# Altium footprint library 16-PCBa Modl.PcbLib: 81 footprints (part 5 of 6)
Each footprint in its own frame and in the unit in brackets; x right, y up, seen from the top. Pads: shape width x height; smd on the part's side, far side on the other; paste and mask are expansions set on the pad; w line width, h text height; cw(c..) or ccw(c..) is an arc to the next point about the centre after c.
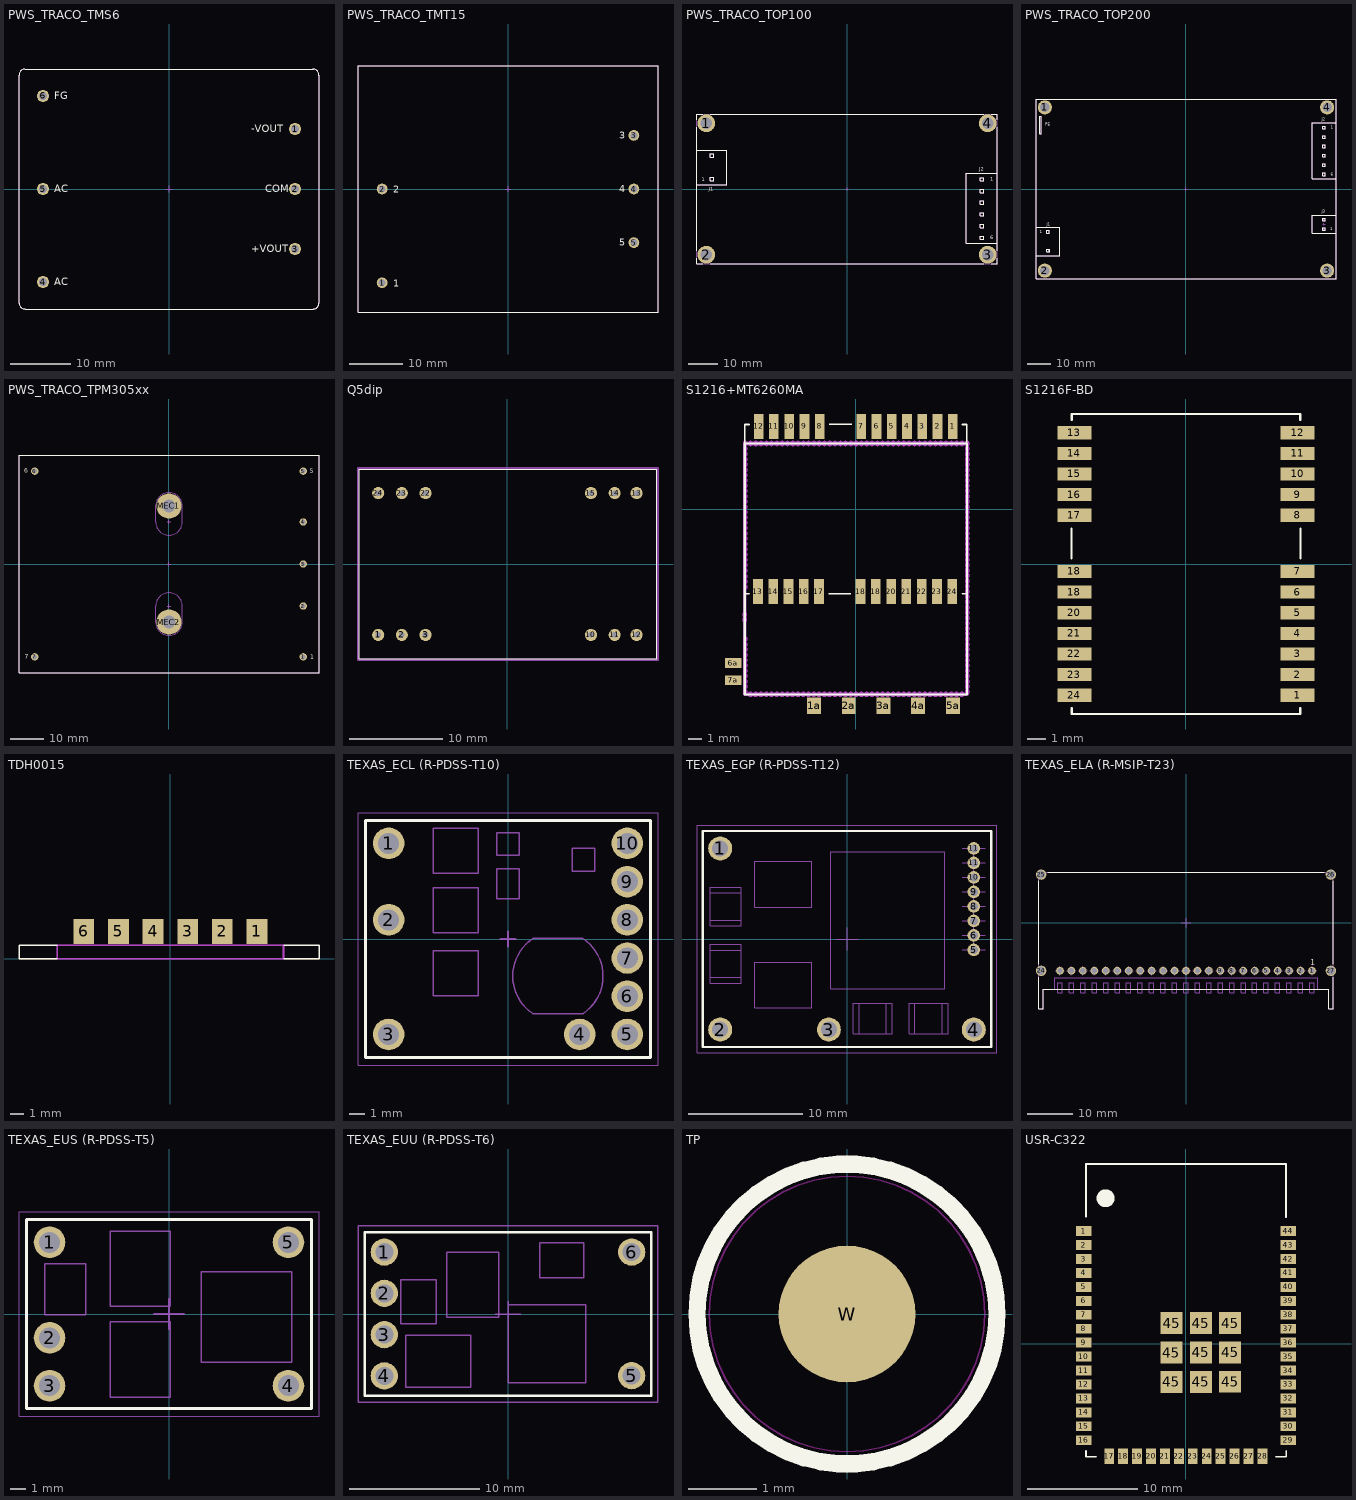
[diagram p4: the footprints below, top view; thin cyan lines are the x and y axes]

## PWS_TRACO_TMS6 [mm] "TMS 6 Series , Body 50x40mm, Height 20mm"
height 20
pads (6):
  round 2 hole 1.3: 1(21,10) 2(21,0) 3(21,-10) 4(-21,-15.5) 5(-21,0) 6(-21,15.5)
Top Overlay:
  lines w0.2: -25,-19 ccw(c-24,-19) -24,-20 24,-20 ccw(c24,-19) 25,-19 25,19 ccw(c24,19) 24,20 -24,20 ccw(c-24,19) -25,19 -25,-19
  text "-VOUT" at 13.719,9.495 h1.2
  text "COM" at 16.025,-0.55 h1.2
  text "+VOUT" at 13.719,-10.505 h1.2
  text "FG" at -19.125,14.95 h1.2
  text "AC" at -19.125,-0.55 h1.2
  text "AC" at -19.125,-16.05 h1.2
Mechanical 8:
  lines w0.1: -21.5,-15.5 -21,-15.5 ; -21.5,0 -21,0 ; -21.5,15.5 -21,15.5 ; -21,-16 -21,-15.5 ; -21,-15 -21,-15.5 ; -21,-0.5 -21,0 ; -21,0.5 -21,0 ; -21,15 -21,15.5 ; -21,16 -21,15.5 ; -20.5,-15.5 -21,-15.5 ; -20.5,0 -21,0 ; -20.5,15.5 -21,15.5 ; -0.5,0 0,0 ; 0,-0.5 0,0 ; 0,0.5 0,0 ; 0.5,0 0,0 ; 20.5,-10 21,-10 ; 20.5,0 21,0 ; 20.5,10 21,10 ; 21,-10.5 21,-10 ; 21,-9.5 21,-10 ; 21,-0.5 21,0 ; 21,0.5 21,0 ; 21,9.5 21,10 ; 21,10.5 21,10 ; 21.5,-10 21,-10 ; 21.5,0 21,0 ; 21.5,10 21,10
Mechanical 14:
  lines w0.1: -25,-19 ccw(c-24,-19) -24,-20 24,-20 ccw(c24,-19) 25,-19 25,19 ccw(c24,19) 24,20 -24,20 ccw(c-24,19) -25,19 -25,-19
  text "AC" at -19.125,-16.05 h1.2
  text "AC" at -19.125,-0.55 h1.2
  text "FG" at -19.125,14.95 h1.2
  text "+VOUT" at 13.719,-10.505 h1.2
  text "COM" at 16.025,-0.55 h1.2
  text "-VOUT" at 13.719,9.495 h1.2
3D body "PWS_TRACO_TMS6.stp": height 20.1, standoff -3.6, extent -25,-20 25,20

## PWS_TRACO_TMT15 [mm] "TMT  15W Model For PCB Mount, Body 55x45mm"
height 25
pads (5):
  round 2 hole 1.3: 1(-23.5,-17.5) 2(-23.5,0) 3(23.5,10) 4(23.5,0) 5(23.5,-10)
Top Overlay:
  lines w0.2: -28,-23 28,-23 28,23 -28,23 -28,-23
  text "3" at 20.72,9.41 h1.27
  text "4" at 20.72,-0.59 h1.27
  text "5" at 20.72,-10.59 h1.27
  text "2" at -21.42,-0.71 h1.27
  text "1" at -21.42,-18.21 h1.27
Mechanical 8:
  lines w0.1: -24,-17.5 -23.5,-17.5 ; -24,0 -23.5,0 ; -23.5,-18 -23.5,-17.5 ; -23.5,-17 -23.5,-17.5 ; -23.5,-0.5 -23.5,0 ; -23.5,0.5 -23.5,0 ; -23,-17.5 -23.5,-17.5 ; -23,0 -23.5,0 ; -0.5,0 0,0 ; 0,-0.5 0,0 ; 0,0.5 0,0 ; 0.5,0 0,0 ; 23,-10 23.5,-10 ; 23,0 23.5,0 ; 23,10 23.5,10 ; 23.5,-10.5 23.5,-10 ; 23.5,-9.5 23.5,-10 ; 23.5,-0.5 23.5,0 ; 23.5,0.5 23.5,0 ; 23.5,9.5 23.5,10 ; 23.5,10.5 23.5,10 ; 24,-10 23.5,-10 ; 24,0 23.5,0 ; 24,10 23.5,10
Mechanical 14:
  lines w0.1: -28,-23 -28,23 28,23 28,-23 -28,-23
  text "3" at 20.72,9.41 h1.27
  text "4" at 20.72,-0.59 h1.27
  text "5" at 20.72,-10.59 h1.27
  text "2" at -21.42,-0.71 h1.27
  text "1" at -21.42,-18.21 h1.27
3D body "PWS_TRACO_TMT15.stp": height 25, standoff -3.8, extent -28,-23 28,23

## PWS_TRACO_TOP100 [mm] "TOP 100 Serie 100W Power Supplies, Body 101.6 x 50.8mm"
height 33.2
pads (4):
  round 6 hole 4: 1(-47.65,22.25) 2(-47.65,-22.25) 3(47.65,-22.25) 4(47.65,22.25)
Top Overlay:
  lines w0.2: -50.8,-23.53 -50.8,-25.4 -48.93,-25.4 ; -50.8,-20.97 -50.8,20.97 ; -50.8,1.465 -40.792,1.465 -40.792,13.2 -50.8,13.2 ; -50.8,23.53 -50.8,25.4 -48.93,25.4 ; -46.37,-25.4 46.37,-25.4 ; -46.37,25.4 46.37,25.4 ; 48.93,-25.4 50.8,-25.4 50.8,-23.53 ; 48.93,25.4 50.8,25.4 50.8,23.53 ; 50.8,-20.97 50.8,20.97 ; 50.8,-3.16 50.8,-18.4 40.4,-18.4 40.4,5.34 50.8,5.34 ; -46.266,2.799 -45.123,2.799 -45.123,3.942 -46.266,3.942 -46.266,2.799 ; -46.266,10.724 -45.123,10.724 -45.123,11.867 -46.266,11.867 -46.266,10.724 ; 45.123,-17.067 46.266,-17.067 46.266,-15.924 45.123,-15.924 45.123,-17.067 ; 45.123,-13.104 46.266,-13.104 46.266,-11.961 45.123,-11.961 45.123,-13.104 ; 45.123,-9.142 46.266,-9.142 46.266,-7.999 45.123,-7.999 45.123,-9.142 ; 45.123,-5.179 46.266,-5.179 46.266,-4.036 45.123,-4.036 45.123,-5.179 ; 45.123,-1.217 46.266,-1.217 46.266,-0.074 45.123,-0.074 45.123,-1.217 ; 45.123,2.746 46.266,2.746 46.266,3.889 45.123,3.889 45.123,2.746
  text "J1" at -46.825,-0.51 h1.2
  text "J2" at 44.775,6.19 h1.2
  text "1" at 48.525,2.79 h1.2
  text "6" at 48.525,-17.022 h1.2
  text "1" at -49.141,2.644 h1.2
Mechanical 8:
  lines w0.1: -48.15,-22.25 -47.65,-22.25 ; -48.15,22.25 -47.65,22.25 ; -47.65,-22.75 -47.65,-22.25 ; -47.65,-21.75 -47.65,-22.25 ; -47.65,21.75 -47.65,22.25 ; -47.65,22.75 -47.65,22.25 ; -47.15,-22.25 -47.65,-22.25 ; -47.15,22.25 -47.65,22.25 ; -0.5,0 0,0 ; 0,-0.5 0,0 ; 0,0.5 0,0 ; 0.5,0 0,0 ; 47.15,-22.25 47.65,-22.25 ; 47.15,22.25 47.65,22.25 ; 47.65,-22.75 47.65,-22.25 ; 47.65,-21.75 47.65,-22.25 ; 47.65,21.75 47.65,22.25 ; 47.65,22.75 47.65,22.25 ; 48.15,-22.25 47.65,-22.25 ; 48.15,22.25 47.65,22.25
Mechanical 14:
  circle w0.1: c-47.65,-22.25 r2
  circle w0.1: c-47.65,22.25 r2
  circle w0.1: c47.65,22.25 r2
  circle w0.1: c47.65,-22.25 r2
  lines w0.1: -50.8,1.465 -40.792,1.465 -40.792,13.2 -50.8,13.2 ; 50.8,-18.4 40.4,-18.4 40.4,5.34 50.8,5.34 ; -50.8,-25.4 50.8,-25.4 50.8,25.4 -50.8,25.4 -50.8,-25.4 ; -46.266,2.799 -45.123,2.799 -45.123,3.942 -46.266,3.942 -46.266,2.799 ; -46.266,10.724 -45.123,10.724 -45.123,11.867 -46.266,11.867 -46.266,10.724 ; 45.123,-17.067 46.266,-17.067 46.266,-15.924 45.123,-15.924 45.123,-17.067 ; 45.123,-13.104 46.266,-13.104 46.266,-11.961 45.123,-11.961 45.123,-13.104 ; 45.123,-9.142 46.266,-9.142 46.266,-7.999 45.123,-7.999 45.123,-9.142 ; 45.123,-5.179 46.266,-5.179 46.266,-4.036 45.123,-4.036 45.123,-5.179 ; 45.123,-1.217 46.266,-1.217 46.266,-0.074 45.123,-0.074 45.123,-1.217 ; 45.123,2.746 46.266,2.746 46.266,3.889 45.123,3.889 45.123,2.746
  text "J1" at -46.825,-0.51 h1.2
  text "J2" at 44.775,6.19 h1.2
  text "1" at 48.525,2.79 h1.2
  text "6" at 48.525,-17.022 h1.2
  text "1" at -49.141,2.644 h1.2
3D body "PWS_TRACO_TOP100.stp": height 34.8, standoff -5.4, extent -50.8,-25.425 50.8,25.426

## PWS_TRACO_TOP200 [mm] "TOP 200 Serie 200W Power Supplies, Body 127 x 76.2mm"
height 35.4
pads (4):
  round 6 hole 4: 1(-59.75,34.55) 2(-59.75,-34.55) 3(59.75,-34.55) 4(59.75,34.55)
Top Overlay:
  lines w0.2: -63.5,-28.219 -53.492,-28.219 -53.492,-16.205 -63.5,-16.205 ; 56.236,4.293 63.5,4.318 53.492,4.318 53.492,27.975 63.5,27.975 ; 59.436,-18.8 57.214,-18.8 63.5,-18.8 ; 59.436,-11.028 57.214,-11.028 63.5,-11.028 ; 61.576,-18.8 63.5,-18.8 ; 61.576,-11.028 63.5,-11.028 ; -58.966,-26.607 -57.823,-26.607 -57.823,-25.464 -58.966,-25.464 ; -58.966,-26.607 -58.966,-25.464 ; -58.966,-26.607 -58.966,-25.464 ; -58.966,-26.607 -57.747,-26.607 -57.747,-25.464 -58.966,-25.464 ; -58.966,-18.682 -57.823,-18.682 ; -58.966,-18.682 -58.966,-17.539 ; -58.966,-18.682 -58.966,-17.539 ; -58.966,-18.682 -57.823,-18.682 ; -58.966,-17.539 -57.823,-17.539 ; -58.966,-17.539 -57.823,-17.539 ; -57.823,-18.682 -57.823,-17.539 ; -57.823,-18.682 -57.823,-17.539 ; 63.5,-18.8 53.492,-18.8 53.492,-11.028 63.5,-11.028 ; -63.5,-38.1 -63.5,38.1 63.5,38.1 63.5,-38.1 -63.5,-38.1 ; -62,23.307 -61.2,23.307 -61.2,30.8 -62,30.8 -62,23.307 ; 57.823,-17.467 58.966,-17.467 58.966,-16.324 57.823,-16.324 57.823,-17.467 ; 57.823,-13.504 58.966,-13.504 58.966,-12.361 57.823,-12.361 57.823,-13.504 ; 57.823,5.652 58.966,5.652 58.966,6.795 57.823,6.795 57.823,5.652 ; 57.823,9.614 58.966,9.614 58.966,10.757 57.823,10.757 57.823,9.614 ; 57.823,13.576 58.966,13.576 58.966,14.719 57.823,14.719 57.823,13.576 ; 57.823,17.539 58.966,17.539 58.966,18.682 57.823,18.682 57.823,17.539 ; 57.823,21.501 58.966,21.501 58.966,22.644 57.823,22.644 57.823,21.501 ; 57.823,25.464 58.966,25.464 58.966,26.607 57.823,26.607 57.823,25.464
  text "1" at 61.025,-17.554 h1.2
  text "J3" at 57.541,-10.109 h1.2
  text "PE" at -59.659,26.691 h1.2
  text "1" at -61.841,-18.836 h1.2
  text "J1" at -58.925,-15.515 h1.2
  text "6" at 61.225,5.696 h1.2
  text "1" at 61.225,25.508 h1.2
  text "J2" at 57.475,28.908 h1.2
Mechanical 8:
  lines w0.1: -60.25,-34.55 -59.75,-34.55 ; -60.25,34.55 -59.75,34.55 ; -59.75,-35.05 -59.75,-34.55 ; -59.75,-34.05 -59.75,-34.55 ; -59.75,34.05 -59.75,34.55 ; -59.75,35.05 -59.75,34.55 ; -59.25,-34.55 -59.75,-34.55 ; -59.25,34.55 -59.75,34.55 ; -0.5,0 0,0 ; 0,-0.5 0,0 ; 0,0.5 0,0 ; 0.5,0 0,0 ; 57.895,-16.895 58.395,-16.895 ; 57.895,-14.914 58.395,-14.914 ; 57.895,-12.933 58.395,-12.933 ; 58.395,-17.395 58.395,-16.895 ; 58.395,-16.395 58.395,-16.895 ; 58.395,-15.414 58.395,-14.914 ; 58.395,-14.414 58.395,-14.914 ; 58.395,-13.433 58.395,-12.933 ; 58.395,-12.433 58.395,-12.933 ; 58.895,-16.895 58.395,-16.895 ; 58.895,-14.914 58.395,-14.914 ; 58.895,-12.933 58.395,-12.933 ; 59.25,-34.55 59.75,-34.55 ; 59.25,34.55 59.75,34.55 ; 59.75,-35.05 59.75,-34.55 ; 59.75,-34.05 59.75,-34.55 ; 59.75,34.05 59.75,34.55 ; 59.75,35.05 59.75,34.55 ; 60.25,-34.55 59.75,-34.55 ; 60.25,34.55 59.75,34.55
Mechanical 14:
  circle w0.1: c-59.75,34.55 r2
  circle w0.1: c-59.75,-34.55 r2
  circle w0.1: c59.75,-34.55 r2
  circle w0.1: c59.75,34.55 r2
  lines w0.1: -63.5,-28.219 -53.492,-28.219 -53.492,-16.205 -63.5,-16.205 ; 56.236,4.293 63.5,4.318 53.492,4.318 53.492,27.975 63.5,27.975 ; 59.436,-18.8 57.214,-18.8 63.5,-18.8 ; 59.436,-11.028 57.214,-11.028 63.5,-11.028 ; 61.576,-18.8 63.5,-18.8 ; 61.576,-11.028 63.5,-11.028 ; -58.966,-26.607 -57.823,-26.607 -57.823,-25.464 -58.966,-25.464 ; -58.966,-26.607 -58.966,-25.464 ; -58.966,-26.607 -58.966,-25.464 ; -58.966,-26.607 -57.747,-26.607 -57.747,-25.464 -58.966,-25.464 ; -58.966,-18.682 -57.823,-18.682 ; -58.966,-18.682 -58.966,-17.539 ; -58.966,-18.682 -58.966,-17.539 ; -58.966,-18.682 -57.823,-18.682 ; -58.966,-17.539 -57.823,-17.539 ; -58.966,-17.539 -57.823,-17.539 ; -57.823,-18.682 -57.823,-17.539 ; -57.823,-18.682 -57.823,-17.539 ; 63.5,-18.8 63.5,-11.028 ; 63.5,-18.8 53.492,-18.8 53.492,-11.028 63.5,-11.028 ; -63.5,-38.1 -63.5,38.1 63.5,38.1 63.5,-38.1 -63.5,-38.1 ; -62,23.307 -61.2,23.307 -61.2,30.8 -62,30.8 -62,23.307 ; 57.823,-17.467 58.966,-17.467 58.966,-16.324 57.823,-16.324 57.823,-17.467 ; 57.823,-13.504 58.966,-13.504 58.966,-12.361 57.823,-12.361 57.823,-13.504 ; 57.823,5.652 58.966,5.652 58.966,6.795 57.823,6.795 57.823,5.652 ; 57.823,9.614 58.966,9.614 58.966,10.757 57.823,10.757 57.823,9.614 ; 57.823,13.576 58.966,13.576 58.966,14.719 57.823,14.719 57.823,13.576 ; 57.823,17.539 58.966,17.539 58.966,18.682 57.823,18.682 57.823,17.539 ; 57.823,21.501 58.966,21.501 58.966,22.644 57.823,22.644 57.823,21.501 ; 57.823,25.464 58.966,25.464 58.966,26.607 57.823,26.607 57.823,25.464
  text "1" at 61.025,-17.554 h1.2
  text "J3" at 57.541,-10.109 h1.2
  text "PE" at -59.659,26.691 h1.2
  text "1" at -61.841,-18.836 h1.2
  text "J1" at -58.925,-15.515 h1.2
  text "6" at 61.225,5.696 h1.2
  text "1" at 61.225,25.508 h1.2
  text "J2" at 57.475,28.908 h1.2
3D body "PWS_TRACO_TOP200.stp": height 35.4, standoff -5.4, extent -63.5,-38.1 63.5,38.1

## PWS_TRACO_TPM305xx [mm] "TPM  30/40W Model For PCB Mount, Body 90x65mm"
height 33.5
pads (9):
  round 2.2 hole 1.5: 1(40.5,-28) 2(40.5,-12.7) 3(40.5,0) 4(40.5,12.7) 5(40.5,28) 6(-40.5,28) 7(-40.5,-28)
  round 7.6 hole 3.8: MEC1(0,17.5) MEC2(0,-17.5)
Top Overlay:
  lines w0.2: -45.25,-32.75 -45.25,32.75 45.25,32.75 45.25,-32.75 -45.25,-32.75
  text "5" at 42.48,27.365 h1.27
  text "7" at -43.52,-28.605 h1.27
  text "6" at -43.72,27.46 h1.27
  text "1" at 42.58,-28.71 h1.27
Mechanical 8:
  lines w0.1: -41,-28 -40.5,-28 ; -41,28 -40.5,28 ; -40.5,-28.5 -40.5,-28 ; -40.5,-27.5 -40.5,-28 ; -40.5,27.5 -40.5,28 ; -40.5,28.5 -40.5,28 ; -40,-28 -40.5,-28 ; -40,28 -40.5,28 ; -0.5,-17.5 0,-17.5 ; -0.5,-12.7 0,-12.7 ; -0.5,0 0,0 ; -0.5,12.7 0,12.7 ; -0.5,17.5 0,17.5 ; 0,-18 0,-17.5 ; 0,-17 0,-17.5 ; 0,-13.2 0,-12.7 ; 0,-12.2 0,-12.7 ; 0,-0.5 0,0 ; 0,0.5 0,0 ; 0,12.2 0,12.7 ; 0,13.2 0,12.7 ; 0,17 0,17.5 ; 0,18 0,17.5 ; 0.5,-17.5 0,-17.5 ; 0.5,-12.7 0,-12.7 ; 0.5,0 0,0 ; 0.5,12.7 0,12.7 ; 0.5,17.5 0,17.5 ; 40,-28 40.5,-28 ; 40,-12.7 40.5,-12.7 ; 40,0 40.5,0 ; 40,12.7 40.5,12.7 ; 40,28 40.5,28 ; 40.5,-28.5 40.5,-28 ; 40.5,-27.5 40.5,-28 ; 40.5,-13.2 40.5,-12.7 ; 40.5,-12.2 40.5,-12.7 ; 40.5,-0.5 40.5,0 ; 40.5,0.5 40.5,0 ; 40.5,12.2 40.5,12.7 ; 40.5,13.2 40.5,12.7 ; 40.5,27.5 40.5,28 ; 40.5,28.5 40.5,28 ; 41,-28 40.5,-28 ; 41,-12.7 40.5,-12.7 ; 41,0 40.5,0 ; 41,12.7 40.5,12.7 ; 41,28 40.5,28 ; -4,-17.5 ccw(c0,-17.5) 4,-17.5 4,-12.7 ccw(c0,-12.7) -4,-12.7 -4,-17.5 ; -4,12.7 ccw(c0,12.7) 4,12.7 4,17.5 ccw(c0,17.5) -4,17.5 -4,12.7
Mechanical 14:
  lines w0.1: -45.25,-32.75 -45.25,32.75 45.25,32.75 45.25,-32.75 -45.25,-32.75
  text "5" at 42.48,27.365 h1.27
  text "7" at -43.52,-28.605 h1.27
  text "6" at -43.72,27.46 h1.27
  text "1" at 42.58,-28.71 h1.27
3D body "PWS_TRACO_TPM305xx.stp": height 33.5, standoff -3.6, extent -45.25,-32.75 45.25,32.75

## Q5dip [mm]
height 26.7
pads (12):
  round 1.3 hole 0.6: 1(-13.88,-7.62) 2(-11.34,-7.62) 3(-8.8,-7.62) 10(8.98,-7.62) 11(11.52,-7.62) 12(13.88,-7.62) 13(13.88,7.62) 14(11.52,7.62) 15(8.98,7.62) 22(-8.8,7.62) 23(-11.34,7.62) 24(-13.88,7.62)
Top Overlay:
  lines w0.1: -15.91,-10.16 16.04,-10.16 16.04,10.16 -15.91,10.16 -15.91,-10.16
Mechanical 15:
  lines w0.254: -16.053,-10.287 -16.053,10.287 16.18,10.287 16.18,-10.287 -16.053,-10.287
3D body "q5dip.stp": height 10.18, standoff -3.81, extent -15.875,-10.16 15.875,10.16

## S1216+MT6260MA [mm]
height 26.7
pads (31):
  rect 0.7x1.8 smd: 1(7,5.95) 2(5.9,5.95) 3(4.8,5.95) 4(3.7,5.95) 5(2.6,5.95) 6(1.5,5.95) 7(0.4,5.95) 8(-2.6,5.95) 9(-3.7,5.95) 10(-4.8,5.95) 11(-5.9,5.95) 12(-7,5.95) 13(-7.051,-5.95) 14(-5.951,-5.95) 15(-4.851,-5.95) 16(-3.751,-5.95) 17(-2.651,-5.95) 18(0.349,-5.95) 18(1.449,-5.95) 20(2.549,-5.95) 21(3.649,-5.95) 22(4.749,-5.95) 23(5.849,-5.95) 24(6.949,-5.95)
  rect 1x1.2 smd: 1a(-3.001,-14.173) 2a(-0.501,-14.173) 3a(1.999,-14.173) 4a(4.499,-14.173) 5a(7.01,-14.173)
  rect 1.2x0.7 smd: 6a(-8.839,-11.1) 7a(-8.839,-12.344)
Top Overlay:
  lines w0.1: -1.951,-6.1 -0.351,-6.1 ; -1.9,6.1 -0.3,6.1
  lines w0.127: -8,-6.1 -8,6.1 -7.7,6.1 ; -7.975,-6.1 -7.675,-6.1 ; 7.675,-6.1 7.975,-6.1 ; 7.7,6.1 8,6.1 8,-6.1
  lines w0.152: 7.927,4.724 -8.001,4.724 -8.001,-13.36 8.026,-13.36 8.026,4.724
Keep-Out Layer:
  drawing of 173 lines, arcs and shapes, not listed
Mechanical 1:
  drawing of 173 lines, arcs and shapes, not listed
Mechanical 14:
  lines w0.254: 7.927,4.724 -8.001,4.724 -8.001,-13.36 8.026,-13.36 8.026,4.724
Mechanical 15:
  lines w0.254: 7.925,-13.36 -8.001,-13.36 -8.001,4.724 7.927,4.724
3D body "s1216f-bd_gps.stp": height 2.19, standoff 0, extent -7.975,-6.107 8.025,6.108

## S1216F-BD [mm]
height 26.7
pads (24):
  rect 1.8x0.7 smd: 1(5.95,-7) 2(5.95,-5.9) 3(5.95,-4.8) 4(5.95,-3.7) 5(5.95,-2.6) 6(5.95,-1.5) 7(5.95,-0.4) 8(5.95,2.6) 9(5.95,3.7) 10(5.95,4.8) 11(5.95,5.9) 12(5.95,7) 13(-5.95,7) 14(-5.95,5.9) 15(-5.95,4.8) 16(-5.95,3.7) 17(-5.95,2.6) 18(-5.95,-1.5) 18(-5.95,-0.4) 20(-5.95,-2.6) 21(-5.95,-3.7) 22(-5.95,-4.8) 23(-5.95,-5.9) 24(-5.95,-7)
Top Overlay:
  lines w0.1: -6.1,0.3 -6.1,1.9 ; 6.1,0.3 6.1,1.9
  lines w0.127: -6.1,-7.7 -6.1,-8 6.1,-8 6.1,-7.7 ; -6.1,7.7 -6.1,8 6.1,8 6.1,7.7
3D body "s1216f-bd_gps.stp": height 2.19, standoff 0, extent -6.107,-8 6.108,8

## TDH0015 [mm]
height 26.7
pads (6):
  rect 1.524x1.8 smd: 1(6.35,2) 2(3.81,2) 3(1.27,2) 4(-1.27,2) 5(-3.81,2) 6(-6.35,2)
Top Overlay:
  lines w0.1: -8.3,0 -11.1,0 -11.1,1 -8.3,1 ; 8.3,0 10.9,0 10.9,1 8.3,1
Keep-Out Layer:
  lines w0.125: -8.3,0 8.3,0 8.3,1 -8.3,1 -8.3,0
Mechanical 1:
  lines w0.125: -8.3,0 -8.3,1 8.3,1 8.3,0 -8.3,0
3D body "TDH0015.step": height 10.92, standoff -2.8, extent -11.239,-6.37 11.239,3.4

## TEXAS_ECL (R-PDSS-T10) [mm] "Texas ECL (R-PDSS-T10)  Case"
height 8.5
pads (10):
  round 2.1 hole 1.4: 1(-7.935,6.355) 2(-7.935,1.275) 3(-7.935,-6.345) 4(4.765,-6.345) 5(7.935,-6.345) 6(7.935,-3.805) 7(7.935,-1.265) 8(7.935,1.275) 9(7.935,3.815) 10(7.935,6.355)
Top Overlay:
  lines w0.2: -9.46,-7.875 9.46,-7.875 9.46,7.875 -9.46,7.875 -9.46,-7.875
Mechanical 8:
  lines w0.1: -8.435,-6.345 -7.935,-6.345 ; -8.435,1.275 -7.935,1.275 ; -8.435,6.355 -7.935,6.355 ; -7.935,-6.845 -7.935,-6.345 ; -7.935,-5.845 -7.935,-6.345 ; -7.935,0.775 -7.935,1.275 ; -7.935,1.775 -7.935,1.275 ; -7.935,5.855 -7.935,6.355 ; -7.935,6.855 -7.935,6.355 ; -7.435,-6.345 -7.935,-6.345 ; -7.435,1.275 -7.935,1.275 ; -7.435,6.355 -7.935,6.355 ; -0.5,0 0,0 ; 0,-0.5 0,0 ; 0,0.5 0,0 ; 0.5,0 0,0 ; 4.265,-6.345 4.765,-6.345 ; 4.765,-6.845 4.765,-6.345 ; 4.765,-5.845 4.765,-6.345 ; 5.265,-6.345 4.765,-6.345 ; 7.435,-6.345 7.935,-6.345 ; 7.435,-3.805 7.935,-3.805 ; 7.435,-1.265 7.935,-1.265 ; 7.435,1.275 7.935,1.275 ; 7.435,3.815 7.935,3.815 ; 7.435,6.355 7.935,6.355 ; 7.935,-6.845 7.935,-6.345 ; 7.935,-5.845 7.935,-6.345 ; 7.935,-4.305 7.935,-3.805 ; 7.935,-3.305 7.935,-3.805 ; 7.935,-1.765 7.935,-1.265 ; 7.935,-0.765 7.935,-1.265 ; 7.935,0.775 7.935,1.275 ; 7.935,1.775 7.935,1.275 ; 7.935,3.315 7.935,3.815 ; 7.935,4.315 7.935,3.815 ; 7.935,5.855 7.935,6.355 ; 7.935,6.855 7.935,6.355 ; 8.435,-6.345 7.935,-6.345 ; 8.435,-3.805 7.935,-3.805 ; 8.435,-1.265 7.935,-1.265 ; 8.435,1.275 7.935,1.275 ; 8.435,3.815 7.935,3.815 ; 8.435,6.355 7.935,6.355
Mechanical 14:
  lines w0.1: -9.46,-7.875 9.46,-7.875 9.46,7.875 -9.46,7.875 -9.46,-7.875 ; -4.963,-3.774 -4.963,-0.774 -1.963,-0.774 -1.963,-3.774 -4.963,-3.774 ; -4.963,0.422 -4.963,3.422 -1.963,3.422 -1.963,0.422 -4.963,0.422 ; -4.963,4.361 -4.963,7.361 -1.963,7.361 -1.963,4.361 -4.963,4.361 ; -0.75,2.683 -0.75,4.683 0.75,4.683 0.75,2.683 -0.75,2.683 ; -0.75,5.572 -0.75,7.072 0.75,7.072 0.75,5.572 -0.75,5.572 ; 1.656,-4.966 cw(c3.314,-2.466) 1.656,0.034 4.972,0.034 cw(c3.314,-2.466) 4.972,-4.966 1.656,-4.966 ; 4.255,4.516 4.255,6.016 5.755,6.016 5.755,4.516 4.255,4.516
Mechanical 15:
  lines w0.05: -9.97,-8.38 9.97,-8.38 9.97,8.38 -9.97,8.38 -9.97,-8.38
3D body "TEXAS_ECL (R-PDSS-T10).stp": height 8.5, standoff -3.55, extent -9.46,-7.875 9.46,7.875

## TEXAS_EGP (R-PDSS-T12) [mm] "Texas EGP (R-PDSS-T12) Case"
height 9.65
pads (12):
  round 2.1 hole 1.4: 1(-11.11,7.94) 2(-11.11,-7.94) 3(-1.59,-7.94) 4(11.11,-7.94)
  round 1.1 hole 0.7: 5(11.11,-0.95) 6(11.11,0.32) 7(11.11,1.59) 8(11.11,2.86) 9(11.11,4.13) 10(11.11,5.4) 11(11.11,6.67) 11(11.11,7.94)
Top Overlay:
  lines w0.2: -12.635,-9.46 -12.635,9.46 12.635,9.46 12.635,-9.46 -12.635,-9.46
Mechanical 8:
  lines w0.1: -12.11,-7.94 -11.11,-7.94 ; -12.11,7.94 -11.11,7.94 ; -11.11,-8.94 -11.11,-7.94 ; -11.11,-6.94 -11.11,-7.94 ; -11.11,6.94 -11.11,7.94 ; -11.11,8.94 -11.11,7.94 ; -10.11,-7.94 -11.11,-7.94 ; -10.11,7.94 -11.11,7.94 ; -2.59,-7.94 -1.59,-7.94 ; -1.59,-8.94 -1.59,-7.94 ; -1.59,-6.94 -1.59,-7.94 ; -1,0 0,0 ; -0.59,-7.94 -1.59,-7.94 ; 0,-1 0,0 ; 0,1 0,0 ; 1,0 0,0 ; 10.11,-7.94 11.11,-7.94 ; 10.11,-0.95 11.11,-0.95 ; 10.11,0.32 11.11,0.32 12.11,0.32 ; 10.11,1.59 11.11,1.59 12.11,1.59 ; 10.11,2.86 11.11,2.86 12.11,2.86 ; 10.11,4.13 11.11,4.13 12.11,4.13 ; 10.11,5.4 11.11,5.4 12.11,5.4 ; 10.11,6.67 11.11,6.67 12.11,6.67 ; 10.11,7.94 11.11,7.94 ; 11.11,-8.94 11.11,-7.94 ; 11.11,-6.94 11.11,-7.94 ; 12.11,-7.94 11.11,-7.94 ; 12.11,-0.95 11.11,-0.95 ; 12.11,7.94 11.11,7.94 ; 11.11,-0.95 11.11,7.94
Mechanical 14:
  lines w0.1: -11.987,-3.37 -9.287,-3.37 ; -11.987,-0.97 -9.287,-0.97 ; -11.987,1.648 -9.287,1.648 ; -11.987,4.048 -9.287,4.048 ; 1.053,-8.309 1.053,-5.609 ; 3.453,-8.309 3.453,-5.609 ; 5.957,-8.309 5.957,-5.609 ; 8.357,-8.309 8.357,-5.609 ; -12.635,-9.46 -12.635,9.46 12.635,9.46 12.635,-9.46 -12.635,-9.46 ; -11.987,-3.87 -11.987,-0.47 -9.287,-0.47 -9.287,-3.87 -11.987,-3.87 ; -11.987,1.148 -11.987,4.548 -9.287,4.548 -9.287,1.148 -11.987,1.148 ; -8.076,-6.046 -8.076,-2.046 -3.076,-2.046 -3.076,-6.046 -8.076,-6.046 ; -8.076,2.804 -8.076,6.804 -3.076,6.804 -3.076,2.804 -8.076,2.804 ; -1.431,-4.339 8.569,-4.339 8.569,7.661 -1.431,7.661 -1.431,-4.339 ; 0.553,-8.309 0.553,-5.609 3.953,-5.609 3.953,-8.309 0.553,-8.309 ; 5.457,-8.309 5.457,-5.609 8.857,-5.609 8.857,-8.309 5.457,-8.309
Mechanical 15:
  lines w0.1: -13.145,-9.97 13.145,-9.97 13.145,9.97 -13.145,9.97 -13.145,-9.97
3D body "TEXAS_EGP (R-PDSS-T12).stp": height 9.65, standoff -3.55, extent -12.635,-9.46 12.635,9.46

## TEXAS_ELA (R-MSIP-T23) [mm] "TEXAS (R-MSIP-T23) Case"
height 12.7
pads (27):
  round 1.7 hole 1.2: 1(27.94,-10.665) 2(25.4,-10.665) 3(22.86,-10.665) 4(20.32,-10.665) 5(17.78,-10.665) 6(15.24,-10.665) 7(12.7,-10.665) 8(10.16,-10.665) 9(7.62,-10.665) 10(5.08,-10.665) 11(2.54,-10.665) 12(0,-10.665) 13(-2.54,-10.665) 14(-5.08,-10.665) 15(-7.62,-10.665) 16(-10.16,-10.665) 17(-12.7,-10.665) 18(-15.24,-10.665) 19(-17.78,-10.665) 20(-20.32,-10.665) 21(-22.86,-10.665) 22(-25.4,-10.665) 23(-27.94,-10.665)
  round 2.3 hole 1.8: 24(-32.105,-10.665) 25(-32.105,10.665) 26(32.105,10.665) 27(32.105,-10.665)
Top Overlay:
  lines w0.2: -32.605,-12.079 -32.605,-19.055 -31.605,-19.055 -31.605,-14.735 31.605,-14.735 31.605,-19.055 32.605,-19.055 32.605,-12.079 ; -32.605,-9.251 -32.605,9.251 ; -30.691,11.165 30.691,11.165 ; 32.605,-9.251 32.605,9.251
  text "1" at 27.559,-9.398 h1.27
Mechanical 8:
  lines w0.1: -33.105,-10.665 -32.105,-10.665 ; -33.105,10.665 -32.105,10.665 ; -32.105,-11.665 -32.105,-10.665 ; -32.105,-9.665 -32.105,-10.665 ; -32.105,9.665 -32.105,10.665 ; -32.105,11.665 -32.105,10.665 ; -31.105,-10.665 -32.105,-10.665 ; -31.105,10.665 -32.105,10.665 ; -28.94,-10.665 -27.94,-10.665 ; -27.94,-11.665 -27.94,-10.665 ; -27.94,-9.665 -27.94,-10.665 ; -26.94,-10.665 -27.94,-10.665 ; -26.4,-10.665 -25.4,-10.665 ; -25.4,-11.665 -25.4,-10.665 ; -25.4,-9.665 -25.4,-10.665 ; -24.4,-10.665 -25.4,-10.665 ; -23.86,-10.665 -22.86,-10.665 ; -22.86,-11.665 -22.86,-10.665 ; -22.86,-9.665 -22.86,-10.665 ; -21.86,-10.665 -22.86,-10.665 ; -21.32,-10.665 -20.32,-10.665 ; -20.32,-11.665 -20.32,-10.665 ; -20.32,-9.665 -20.32,-10.665 ; -19.32,-10.665 -20.32,-10.665 ; -18.78,-10.665 -17.78,-10.665 ; -17.78,-11.665 -17.78,-10.665 ; -17.78,-9.665 -17.78,-10.665 ; -16.78,-10.665 -17.78,-10.665 ; -16.24,-10.665 -15.24,-10.665 ; -15.24,-11.665 -15.24,-10.665 ; -15.24,-9.665 -15.24,-10.665 ; -14.24,-10.665 -15.24,-10.665 ; -13.7,-10.665 -12.7,-10.665 ; -12.7,-11.665 -12.7,-10.665 ; -12.7,-9.665 -12.7,-10.665 ; -11.7,-10.665 -12.7,-10.665 ; -11.16,-10.665 -10.16,-10.665 ; -10.16,-11.665 -10.16,-10.665 ; -10.16,-9.665 -10.16,-10.665 ; -9.16,-10.665 -10.16,-10.665 ; -8.62,-10.665 -7.62,-10.665 ; -7.62,-11.665 -7.62,-10.665 ; -7.62,-9.665 -7.62,-10.665 ; -6.62,-10.665 -7.62,-10.665 ; -6.08,-10.665 -5.08,-10.665 ; -5.08,-11.665 -5.08,-10.665 ; -5.08,-9.665 -5.08,-10.665 ; -4.08,-10.665 -5.08,-10.665 ; -3.54,-10.665 -2.54,-10.665 ; -2.54,-11.665 -2.54,-10.665 ; -2.54,-9.665 -2.54,-10.665 ; -1.54,-10.665 -2.54,-10.665 ; -1,-10.665 0,-10.665 ; -1,0 0,0 ; 0,-11.665 0,-10.665 ; 0,-9.665 0,-10.665 ; 0,-1 0,0 ; 0,1 0,0 ; 1,-10.665 0,-10.665 ; 1,0 0,0 ; 1.54,-10.665 2.54,-10.665 ; 2.54,-11.665 2.54,-10.665 ; 2.54,-9.665 2.54,-10.665 ; 3.54,-10.665 2.54,-10.665 ; 4.08,-10.665 5.08,-10.665 ; 5.08,-11.665 5.08,-10.665 ; 5.08,-9.665 5.08,-10.665 ; 6.08,-10.665 5.08,-10.665 ; 6.62,-10.665 7.62,-10.665 ; 7.62,-11.665 7.62,-10.665 ; 7.62,-9.665 7.62,-10.665 ; 8.62,-10.665 7.62,-10.665 ; 9.16,-10.665 10.16,-10.665 ; 10.16,-11.665 10.16,-10.665 ; 10.16,-9.665 10.16,-10.665 ; 11.16,-10.665 10.16,-10.665 ; 11.7,-10.665 12.7,-10.665 ; 12.7,-11.665 12.7,-10.665 ; 12.7,-9.665 12.7,-10.665 ; 13.7,-10.665 12.7,-10.665 ; 14.24,-10.665 15.24,-10.665 ; 15.24,-11.665 15.24,-10.665 ; 15.24,-9.665 15.24,-10.665 ; 16.24,-10.665 15.24,-10.665 ; 16.78,-10.665 17.78,-10.665 ; 17.78,-11.665 17.78,-10.665 ; 17.78,-9.665 17.78,-10.665 ; 18.78,-10.665 17.78,-10.665 ; 19.32,-10.665 20.32,-10.665 ; 20.32,-11.665 20.32,-10.665 ; 20.32,-9.665 20.32,-10.665 ; 21.32,-10.665 20.32,-10.665 ; 21.86,-10.665 22.86,-10.665 ; 22.86,-11.665 22.86,-10.665 ; 22.86,-9.665 22.86,-10.665 ; 23.86,-10.665 22.86,-10.665 ; 24.4,-10.665 25.4,-10.665 ; 25.4,-11.665 25.4,-10.665 ; 25.4,-9.665 25.4,-10.665 ; 26.4,-10.665 25.4,-10.665 ; 26.94,-10.665 27.94,-10.665 ; 27.94,-11.665 27.94,-10.665 ; 27.94,-9.665 27.94,-10.665 ; 28.94,-10.665 27.94,-10.665 ; 31.105,-10.665 32.105,-10.665 ; 31.105,10.665 32.105,10.665 ; 32.105,-11.665 32.105,-10.665 ; 32.105,-9.665 32.105,-10.665 ; 32.105,9.665 32.105,10.665 ; 32.105,11.665 32.105,10.665 ; 33.105,-10.665 32.105,-10.665 ; 33.105,10.665 32.105,10.665
Mechanical 14:
  lines w0.1: -29.105,-14.735 -29.105,-12.235 29.105,-12.235 29.105,-14.735 ; -28.44,-14.735 -31.605,-14.735 -31.605,-19.055 -32.605,-19.055 -32.605,11.165 32.605,11.165 32.605,-19.055 31.605,-19.055 31.605,-14.735 28.44,-14.735 ; -27.44,-14.735 -25.9,-14.735 ; -24.9,-14.735 -23.36,-14.735 ; -22.36,-14.735 -20.82,-14.735 ; -19.82,-14.735 -18.28,-14.735 ; -17.28,-14.735 -15.74,-14.735 ; -14.74,-14.735 -13.2,-14.735 ; -12.2,-14.735 -10.66,-14.735 ; -9.66,-14.735 -8.12,-14.735 ; -7.12,-14.735 -5.58,-14.735 ; -4.58,-14.735 -3.04,-14.735 ; -2.04,-14.735 -0.5,-14.735 ; 0.5,-14.735 2.04,-14.735 ; 3.04,-14.735 4.58,-14.735 ; 5.58,-14.735 7.12,-14.735 ; 8.12,-14.735 9.66,-14.735 ; 10.66,-14.735 12.2,-14.735 ; 13.2,-14.735 14.74,-14.735 ; 15.74,-14.735 17.28,-14.735 ; 18.28,-14.735 19.82,-14.735 ; 20.82,-14.735 22.36,-14.735 ; 23.36,-14.735 24.9,-14.735 ; 25.9,-14.735 27.44,-14.735 ; -28.44,-15.535 -28.44,-13.331 -27.44,-13.331 -27.44,-15.535 -28.44,-15.535 ; -25.9,-15.535 -25.9,-13.331 -24.9,-13.331 -24.9,-15.535 -25.9,-15.535 ; -23.36,-15.535 -23.36,-13.331 -22.36,-13.331 -22.36,-15.535 -23.36,-15.535 ; -20.82,-15.535 -20.82,-13.331 -19.82,-13.331 -19.82,-15.535 -20.82,-15.535 ; -18.28,-15.535 -18.28,-13.331 -17.28,-13.331 -17.28,-15.535 -18.28,-15.535 ; -15.74,-15.535 -15.74,-13.331 -14.74,-13.331 -14.74,-15.535 -15.74,-15.535 ; -13.2,-15.535 -13.2,-13.331 -12.2,-13.331 -12.2,-15.535 -13.2,-15.535 ; -10.66,-15.535 -10.66,-13.331 -9.66,-13.331 -9.66,-15.535 -10.66,-15.535 ; -8.12,-15.535 -8.12,-13.331 -7.12,-13.331 -7.12,-15.535 -8.12,-15.535 ; -5.58,-15.535 -5.58,-13.331 -4.58,-13.331 -4.58,-15.535 -5.58,-15.535 ; -3.04,-15.535 -3.04,-13.331 -2.04,-13.331 -2.04,-15.535 -3.04,-15.535 ; -0.5,-15.535 -0.5,-13.331 0.5,-13.331 0.5,-15.535 -0.5,-15.535 ; 2.04,-15.535 2.04,-13.331 3.04,-13.331 3.04,-15.535 2.04,-15.535 ; 4.58,-15.535 4.58,-13.331 5.58,-13.331 5.58,-15.535 4.58,-15.535 ; 7.12,-15.535 7.12,-13.331 8.12,-13.331 8.12,-15.535 7.12,-15.535 ; 9.66,-15.535 9.66,-13.331 10.66,-13.331 10.66,-15.535 9.66,-15.535 ; 12.2,-15.535 12.2,-13.331 13.2,-13.331 13.2,-15.535 12.2,-15.535 ; 14.74,-15.535 14.74,-13.331 15.74,-13.331 15.74,-15.535 14.74,-15.535 ; 17.28,-15.535 17.28,-13.331 18.28,-13.331 18.28,-15.535 17.28,-15.535 ; 19.82,-15.535 19.82,-13.331 20.82,-13.331 20.82,-15.535 19.82,-15.535 ; 22.36,-15.535 22.36,-13.331 23.36,-13.331 23.36,-15.535 22.36,-15.535 ; 24.9,-15.535 24.9,-13.331 25.9,-13.331 25.9,-15.535 24.9,-15.535 ; 27.44,-15.535 27.44,-13.331 28.44,-13.331 28.44,-15.535 27.44,-15.535
  text "1" at 27.559,-9.398 h1.27
3D body "TEXAS_ELA (R-MSIP-T23).stp": height 12.7, standoff -4, extent -32.605,-19.055 32.605,11.165

## TEXAS_EUS (R-PDSS-T5) [mm] "Texas EUS (R-PDSS-T5) Case"
height 8.5
pads (5):
  round 2.1 hole 1.4: 1(-7.94,4.765) 2(-7.94,-1.585) 3(-7.94,-4.765) 4(7.94,-4.765) 5(7.94,4.765)
Top Overlay:
  lines w0.2: -9.46,-6.285 9.46,-6.285 9.46,6.285 -9.46,6.285 -9.46,-6.285
Mechanical 8:
  lines w0.1: -8.94,-4.765 -7.94,-4.765 ; -8.94,-1.585 -7.94,-1.585 ; -8.94,4.765 -7.94,4.765 ; -7.94,-5.765 -7.94,-4.765 ; -7.94,-3.765 -7.94,-4.765 ; -7.94,-2.585 -7.94,-1.585 ; -7.94,-0.585 -7.94,-1.585 ; -7.94,3.765 -7.94,4.765 ; -7.94,5.765 -7.94,4.765 ; -6.94,-4.765 -7.94,-4.765 ; -6.94,-1.585 -7.94,-1.585 ; -6.94,4.765 -7.94,4.765 ; -1,0 0,0 ; 0,-1 0,0 ; 0,1 0,0 ; 1,0 0,0 ; 6.94,-4.765 7.94,-4.765 ; 6.94,4.765 7.94,4.765 ; 7.94,-5.765 7.94,-4.765 ; 7.94,-3.765 7.94,-4.765 ; 7.94,3.765 7.94,4.765 ; 7.94,5.765 7.94,4.765 ; 8.94,-4.765 7.94,-4.765 ; 8.94,4.765 7.94,4.765
Mechanical 14:
  lines w0.1: -9.46,-6.285 -9.46,6.285 9.46,6.285 9.46,-6.285 -9.46,-6.285 ; -8.247,-0.059 -8.247,3.341 -5.547,3.341 -5.547,-0.059 -8.247,-0.059 ; -3.912,-5.523 -3.912,-0.523 0.088,-0.523 0.088,-5.523 -3.912,-5.523 ; -3.912,0.502 -3.912,5.502 0.088,5.502 0.088,0.502 -3.912,0.502 ; 2.154,-3.194 2.154,2.806 8.154,2.806 8.154,-3.194 2.154,-3.194
Mechanical 15:
  lines w0.05: -9.97,-6.795 -9.97,6.795 9.97,6.795 9.97,-6.795 -9.97,-6.795
3D body "TEXAS_EUS (R-PDSS-T5).stp": height 8.5, standoff -3.55, extent -9.46,-6.285 9.46,6.285

## TEXAS_EUU (R-PDSS-T6) [mm] "Texas TEXAS_EUU (R-PDSS-T6) Case"
height 8.5
pads (6):
  round 2.1 hole 1.4: 1(-9.53,4.77) 2(-9.53,1.59) 3(-9.53,-1.59) 4(-9.53,-4.77) 5(9.53,-4.75) 6(9.53,4.77)
Top Overlay:
  lines w0.2: -11.05,-6.285 -11.05,6.285 11.05,6.285 11.05,-6.285 -11.05,-6.285
Mechanical 8:
  lines w0.1: -10.53,-4.77 -9.53,-4.77 ; -10.53,-1.59 -9.53,-1.59 ; -10.53,1.59 -9.53,1.59 ; -10.53,4.77 -9.53,4.77 ; -9.53,-5.77 -9.53,-4.77 ; -9.53,-3.77 -9.53,-4.77 ; -9.53,-2.59 -9.53,-1.59 ; -9.53,-0.59 -9.53,-1.59 ; -9.53,0.59 -9.53,1.59 ; -9.53,2.59 -9.53,1.59 ; -9.53,3.77 -9.53,4.77 ; -9.53,5.77 -9.53,4.77 ; -8.53,-4.77 -9.53,-4.77 ; -8.53,-1.59 -9.53,-1.59 ; -8.53,1.59 -9.53,1.59 ; -8.53,4.77 -9.53,4.77 ; -1,0 0,0 ; 0,-1 0,0 ; 0,1 0,0 ; 1,0 0,0 ; 8.53,-4.75 9.53,-4.75 ; 8.53,4.77 9.53,4.77 ; 9.53,-5.75 9.53,-4.75 ; 9.53,-3.75 9.53,-4.75 ; 9.53,3.77 9.53,4.77 ; 9.53,5.77 9.53,4.77 ; 10.53,-4.75 9.53,-4.75 ; 10.53,4.77 9.53,4.77
Mechanical 14:
  lines w0.1: -11.05,-6.285 -11.05,6.285 11.05,6.285 11.05,-6.285 -11.05,-6.285 ; -8.247,-0.77 -5.547,-0.77 -5.547,2.63 -8.247,2.63 -8.247,-0.77 ; -7.867,-5.631 -2.867,-5.631 -2.867,-1.631 -7.867,-1.631 -7.867,-5.631 ; -4.715,-0.254 -0.715,-0.254 -0.715,4.746 -4.715,4.746 -4.715,-0.254 ; 0,-5.285 6,-5.285 6,0.715 0,0.715 0,-5.285 ; 2.45,2.799 2.45,5.499 5.85,5.499 5.85,2.799 2.45,2.799
Mechanical 15:
  lines w0.1: -11.56,-6.795 -11.56,6.795 11.56,6.795 11.56,-6.795 -11.56,-6.795
3D body "TEXAS_EUU (R-PDSS-T6).stp": height 8.5, standoff -3.55, extent -11.05,-6.285 11.05,6.285

## TP [mm]
height 11.7
pads (1):
  round 2 smd mask+1: W(0,0)
Top Overlay:
  circle w0.254: c0,0 r2.195
Keep-Out Layer:
  circle w0.025: c0,0 r2.017
3D body "1_016-1_016-3_tp.stp": height 0.02, standoff 0, extent -1.5,-1.5 1.5,1.5

## USR-C322 [mm]
height 8.5
pads (53):
  rect 1.4x0.9 smd: 1(-9.31,10.26) 2(-9.31,8.99) 3(-9.31,7.72) 4(-9.31,6.45) 5(-9.31,5.18) 6(-9.31,3.91) 7(-9.31,2.64) 8(-9.31,1.37) 9(-9.31,0.1) 10(-9.31,-1.17) 11(-9.31,-2.44) 12(-9.31,-3.71) 13(-9.31,-4.98) 14(-9.31,-6.25) 15(-9.31,-7.52) 16(-9.31,-8.79) 29(9.31,-8.79) 30(9.31,-7.52) 31(9.31,-6.25) 32(9.31,-4.98) 33(9.31,-3.71) 34(9.31,-2.44) 35(9.31,-1.17) 36(9.31,0.1) 37(9.31,1.37) 38(9.31,2.64) 39(9.31,3.91) 40(9.31,5.18) 41(9.31,6.45) 42(9.31,7.72) 43(9.31,8.99) 44(9.31,10.26)
  rect 0.9x1.4 smd: 17(-7,-10.26) 18(-5.73,-10.26) 19(-4.46,-10.26) 20(-3.19,-10.26) 21(-1.92,-10.26) 22(-0.65,-10.26) 23(0.62,-10.26) 24(1.89,-10.26) 25(3.16,-10.26) 26(4.43,-10.26) 27(5.71,-10.26) 28(6.98,-10.26)
  rect 2x2 smd: 45(-1.332,-0.809) 45(-1.325,-3.47) 45(-1.312,1.885) 45(1.349,1.872) 45(1.349,-3.476) 45(1.362,-0.782) 45(4.017,-3.463) 45(4.03,-0.796) 45(4.03,1.872)
Top Overlay:
  circle w1: c-7.336,13.26 r0.316
  lines w0.152: -9.119,-9.76 -9.119,-10.287 -8.19,-10.287 ; -9.119,11.582 -9.119,16.383 9.119,16.383 9.119,11.557 ; 8.19,-10.287 9.144,-10.287 9.144,-9.76
Mechanical 14:
  lines w0.152: -9.119,11.582 -9.119,16.383 9.119,16.383 9.119,11.557
3D body "usr-wifi_c322.stp": height 2.82, standoff 0, extent -9.106,-10.283 9.13,16.375